# Altium footprint library 我的元件库02.PcbLib: 300 footprints (part 10 of 19)
Each footprint in its own frame and in the unit in brackets; x right, y up, seen from the top. Pads: shape width x height; smd on the part's side, far side on the other; paste and mask are expansions set on the pad; w line width, h text height; cw(c..) or ccw(c..) is an arc to the next point about the centre after c.
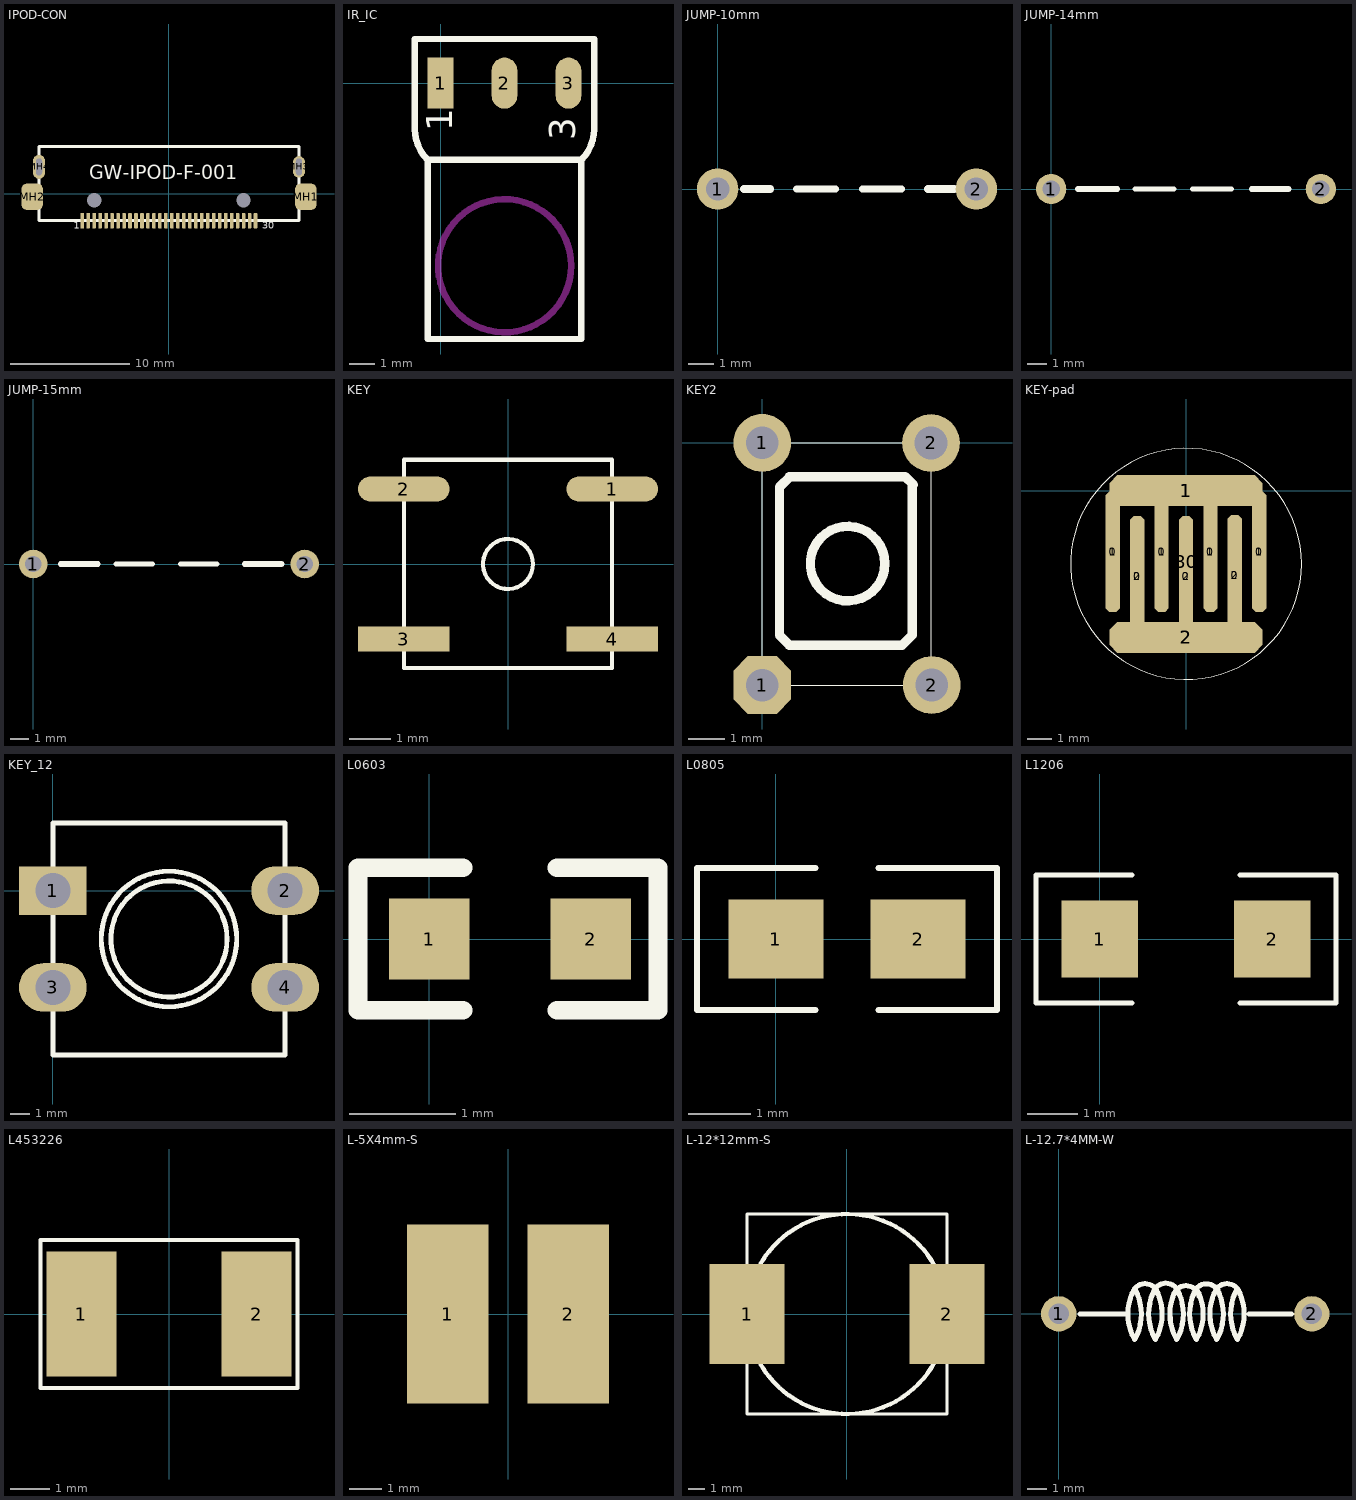
[diagram p9: the footprints below, top view; thin cyan lines are the x and y axes]

## IPOD-CON [mm]
height 2.5
pads (36):
  rect 0.3x1.3 smd: 1(-7.261,-2.25)
  rrect50% 0.3x1.3 smd: 2(-6.761,-2.25) 3(-6.261,-2.25) 4(-5.761,-2.25) 5(-5.261,-2.25) 6(-4.761,-2.25) 7(-4.261,-2.25) 8(-3.761,-2.25) 9(-3.261,-2.25) 10(-2.761,-2.25) 11(-2.261,-2.25) 12(-1.761,-2.25) 13(-1.261,-2.25) 14(-0.761,-2.25) 15(-0.261,-2.25) 16(0.239,-2.25) 17(0.739,-2.25) 18(1.239,-2.25) 19(1.739,-2.25) 20(2.239,-2.25) 21(2.739,-2.25) 22(3.239,-2.25) 23(3.739,-2.25) 24(4.239,-2.25) 25(4.739,-2.25) 26(5.239,-2.25) 27(5.739,-2.25) 28(6.239,-2.25) 29(6.739,-2.25) 30(7.239,-2.25)
  rrect50% 1.8x2.2 smd: MH1(11.45,-0.25) MH2(-11.45,-0.25)
  oval 1x1.8 hole 0.5 slot 1.4 at 90 deg: MH3(10.875,2.25)
  oval 1x2 hole 0.5 slot 1.4 at 90 deg: MH4(-10.875,2.25)
  rrect50% 0.3x0 hole 1.2: ""(-6.261,-0.55) ""(6.239,-0.55)
Top Overlay:
  lines w0.254: -10.875,-2.25 10.875,-2.25 10.875,3.95 -10.875,3.95 -10.875,-2.25
  text "1" at -7.95,-3.15 h1
  text "30" at 7.798,-3.15 h1
  text "GW-IPOD-F-001" at -6.655,0.813 h2
3D body: height 2.2, standoff 0, extent -11.409,-1.968 11.308,3.632

## IR_IC [mm]
pads (3):
  rect 1x2 smd: 1(0,0)
  oval 1x2 smd: 2(2.5,0) 3(5,0)
Top Overlay:
  lines w0.254: -0.5,-3 cw(c0.707,-1.793) -1,-1.793 -1,-1.322 -1,1.726 6,1.726 6,-1.297 6,-1.793 cw(c4.293,-1.793) 5.5,-3 ; -0.5,-3 5.5,-3 ; -0.5,-3 -0.5,-10 5.5,-10 5.5,-3
  text "1" at 0.457,-1.88 h1.02
  text "3" at 5.258,-2.235 h1.02
Keep-Out Layer:
  circle w0.254: c2.505,-7.137 r2.6

## JUMP-10mm [mm]
pads (2):
  round 1.6 hole 0.9: 1(0,0) 2(10,0)
Top Overlay:
  lines w0.254: 3.048,0 4.572,0 ; 5.588,0 7.112,0
  lines w0.305: 1.016,0 2.032,0 ; 8.128,0 9.144,0

## JUMP-14mm [mil]
pads (2):
  round 62 hole 35.43: 1(0,0) 2(551.18,0)
Top Overlay:
  lines w10: 171,0 251,0 ; 289,0 369,0
  lines w12: 55,0 135,0 ; 410,0 485,0

## JUMP-15mm [mil]
pads (2):
  round 62 hole 35.43: 1(0,0) 2(590.55,0)
Top Overlay:
  lines w10: 180,0 260,0 ; 320,0 400,0
  lines w12: 60,0 140,0 ; 460,0 540,0

## KEY [mm]
pads (4):
  oval 2.2x0.6 smd: 1(2.5,1.8) 2(-2.5,1.8)
  rect 2.2x0.6 smd: 3(-2.5,-1.8) 4(2.5,-1.8)
Top Overlay:
  circle w0.1: c0,0 r0.6
  lines w0.1: -2.5,-2.5 -2.5,2.5 2.5,2.5 2.5,-2.5 -2.5,-2.5

## KEY2 [mil]
pads (4):
  oct 62x62 hole 35: 1(0,-259.93)
  round 62 hole 35: 1(0,0) 2(181.1,-0.09) 2(181.89,-259.84)
Top Overlay:
  circle w10: c91.61,-129.56 r40
  lines w1: 181.1,6.13 181.1,-259.93 0,-259.93 0,-0.09 184.55,-0.09
  lines w10: 29.12,-36.39 152.35,-36.39 ; 29.91,-36 18.5,-47.41 18.5,-48.99 18.5,-206.47 29.12,-217.1 149.99,-217.1 161.01,-206.07 161.01,-61.98 161.01,-44.26 ; 153.14,-36 162.19,-45.05

## KEY-pad [mm]
pads (19):
  oct 0.6x5 on Top Paste: 0(-3.048,-2.54) 0(-2.032,-3.556) 0(-1.011,-2.54) 0(0,-3.556) 0(1.016,-2.54) 0(2.032,-3.505) 0(3.048,-2.54)
  oct 0.6x5 smd: 1(-3.048,-2.54) 1(-1.016,-2.54) 1(1.016,-2.54) 1(3.048,-2.54) 2(-2.032,-3.556) 2(0,-3.556) 2(2.032,-3.505)
  oct 6.35x1.27 smd: 1(0,0) 2(0,-6.096)
  oct 6.35x1.27 on Top Paste: 1(0,0) 2(0,-6.096)
  rect 6.5x6.6 on Top Solder: 80(0.002,-2.953)
Top Overlay:
  circle w0.025: c0.005,-3.043 r4.792

## KEY_12 [mm]
pads (4):
  rect 3.5x2.5 hole 1.8: 1(0,0)
  oval 3.5x2.5 hole 1.8: 2(12,0) 3(0,-5) 4(12,-5)
Top Overlay:
  circle w0.254: c6,-2.5 r3.5
  circle w0.254: c6,-2.5 r3
  lines w0.254: 0,-8.5 0,3.5 12,3.5 12,-8.5 0,-8.5

## L0603 [mil]
pads (2):
  rect 30x30 smd: 1(0,0) 2(60,0)
Top Overlay:
  lines w7: -26.5,26.5 -26.5,-26.5 12.5,-26.5 ; -25,26.5 12.5,26.5 ; 47.5,-26.5 85,-26.5 85,26.5 47.5,26.5
3D body: height 17.72, standoff 0, extent -1,-16 61.99,15.5

## L0805 [mil]
pads (2):
  rect 60x50 smd: 1(0,0) 2(90,0)
Top Overlay:
  lines w3.94: 25,-45 -50,-45 -50,45 25,45 ; 65,-45 140,-45 140,45 65,45
3D body: height 37.4, standoff 0, extent 5.63,-23.24 84.37,24

## L1206 [mil]
pads (2):
  rect 60x60 smd: 1(0,0) 2(135,0)
Top Overlay:
  lines w3.94: 25,-50 -50,-50 -50,50 25,50 ; 110,-50 185,-50 185,50 110,50
3D body: height 43.31, standoff 0, extent 5.01,-32 130.99,30.99

## L453226 [mm]
pads (2):
  rect 1.8x3.2 smd: 1(-2.25,0) 2(2.25,0)
Top Overlay:
  lines w0.1: -3.3,-1.9 -3.3,1.9 3.3,1.9 3.3,-1.9 -3.3,-1.9

## L-5X4mm-S [mm]
height 4.5
pads (2):
  rect 2.5x5.5 smd: 1(-1.85,0) 2(1.85,0)
3D body: height 4.5, standoff -0.01, extent -2.857,-2.6 2.857,2.6

## L-12*12mm-S [mm]
height 6
pads (2):
  rect 4.5x6 smd: 1(-6,0) 2(6,0)
Top Overlay:
  circle w0.254: c0,0 r6
  lines w0.2: -6,-3 -6,-6 6,-6 6,-3 ; -6,3 -6,6 6,6 6,3
3D body: height 8, standoff -0.2, extent -6.051,-5.944 5.949,6.056

## L-12.7*4MM-W [mil]
height 196.85
pads (2):
  round 70 hole 40: 1(0,0) 2(500,0)
Top Overlay:
  lines w10: 41.9,0.1 137,0 ; 144.9,37.97 cw(c170.57,33.69) 196.12,38.6 ; 185.9,38.97 cw(c211.57,34.69) 237.12,39.6 ; 225.9,33.97 cw(c251.57,29.69) 277.12,34.6 ; 266.12,37.6 cw(c291.78,33.33) 317.33,38.24 ; 306.9,37.97 cw(c332.57,33.69) 358.12,38.6 ; 376,0 459.88,0.12 ; 149.86,50.46 cw(c59.12,-0.4) 150,-51 cw(c240.74,-0.15) 149.86,50.46 ; 190.86,50.46 ccw(c281.74,-0.15) 191,-51 ccw(c100.12,-0.4) 190.86,50.46 ; 232.86,50.46 ccw(c323.74,-0.15) 233,-51 ccw(c142.12,-0.4) 232.86,50.46 ; 271.86,50.46 ccw(c362.74,-0.15) 272,-51 ccw(c181.12,-0.4) 271.86,50.46 ; 311.86,50.46 ccw(c402.74,-0.15) 312,-51 ccw(c221.12,-0.4) 311.86,50.46 ; 352.86,50.46 cw(c262.12,-0.4) 353,-51 cw(c443.74,-0.15) 352.86,50.46
3D body: height 161.42, standoff -51.18, extent -9,-60 506.75,65.98